# Altium footprint library 3.22-杂项.PcbLib: 985 footprints (part 4 of 64)
Each footprint in its own frame and in the unit in brackets; x right, y up, seen from the top. Pads: shape width x height; smd on the part's side, far side on the other; paste and mask are expansions set on the pad; w line width, h text height; cw(c..) or ccw(c..) is an arc to the next point about the centre after c.
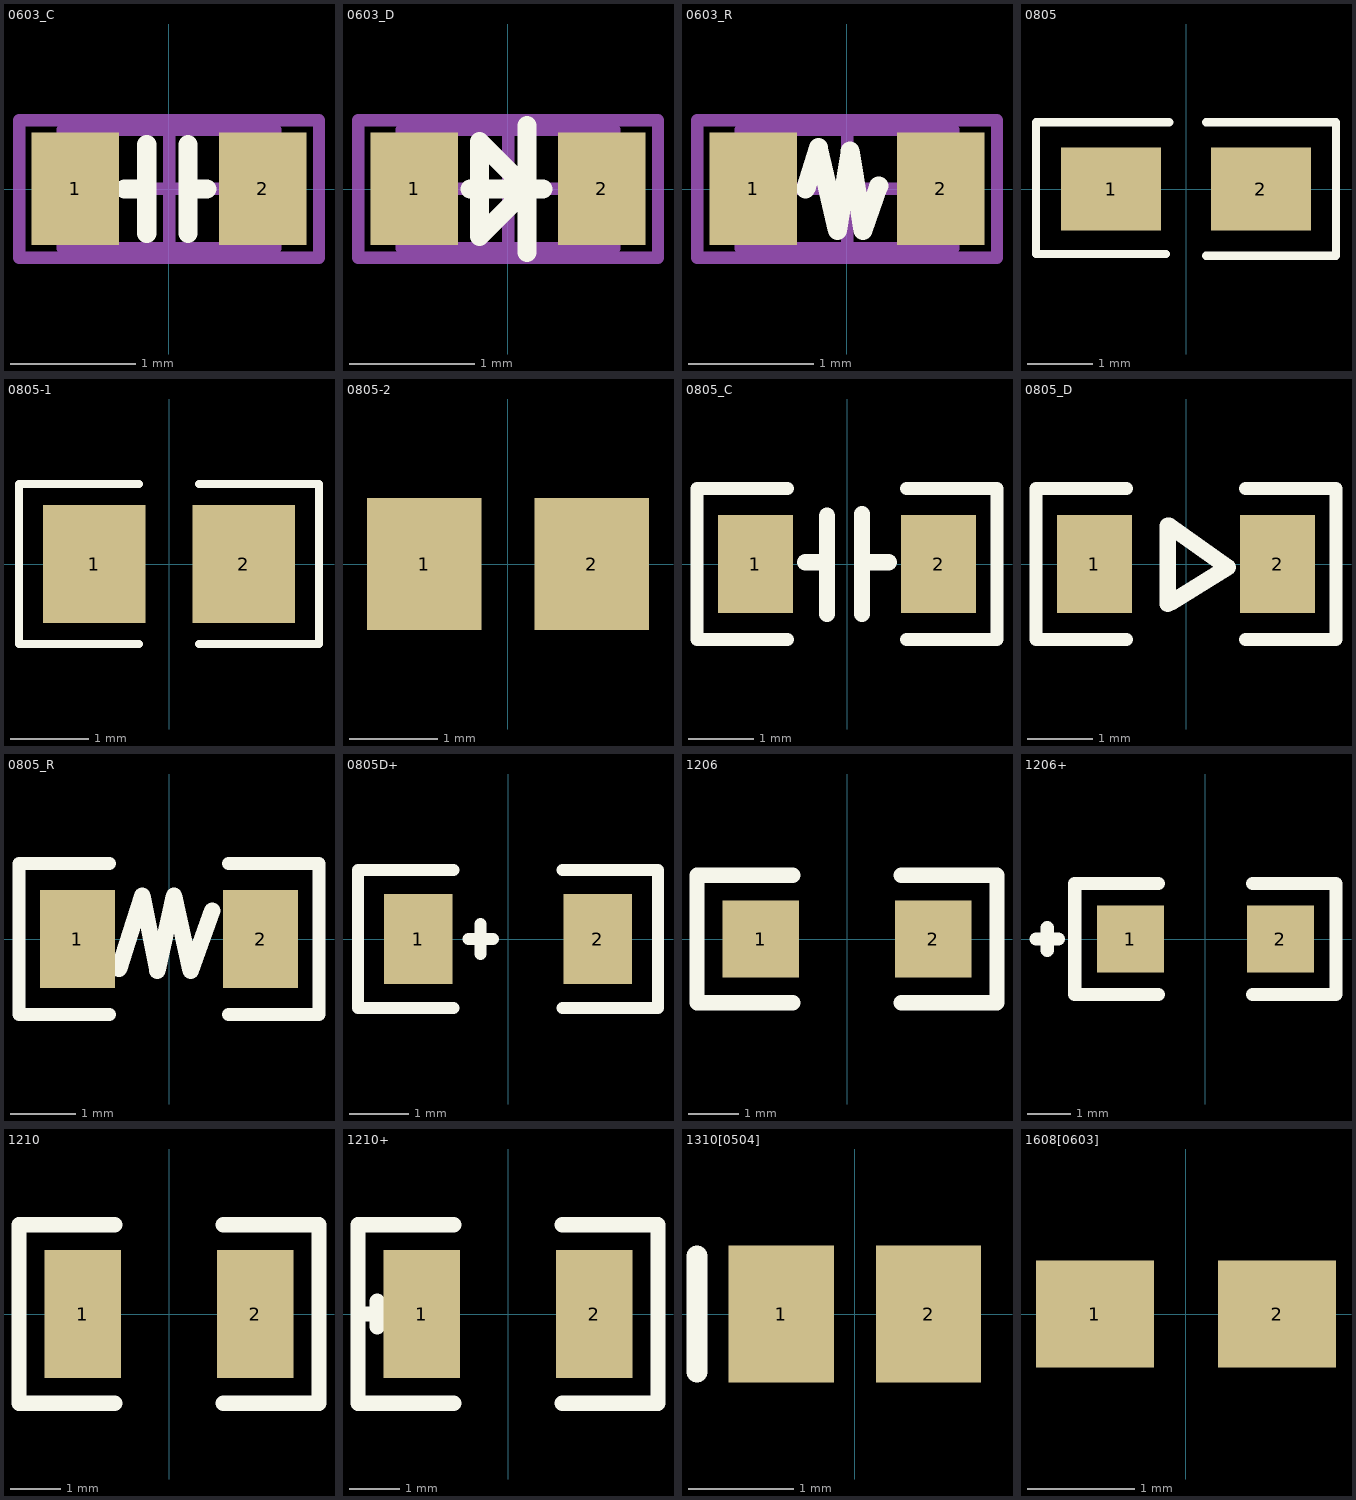
[diagram p3: the footprints below, top view; thin cyan lines are the x and y axes]

## 0603_C [mm]
pads (2):
  rect 0.7x0.9 smd: 1(-0.75,0) 2(0.75,0)
Top Overlay:
  lines w0.152: -0.356,0 -0.229,0 ; -0.178,-0.356 -0.178,0.356 ; 0.152,-0.356 0.152,0.356 ; 0.203,0 0.305,0
Mechanical 13:
  lines w0.1: -0.85,-0.475 -0.85,0.475 0.85,0.475 0.85,-0.475 -0.85,-0.475
Mechanical 15:
  lines w0.1: -0.475,0 0.475,0 ; 0,-0.475 0,0.475 ; -1.2,-0.55 -1.2,0.55 1.2,0.55 1.2,-0.55 -1.2,-0.55
3D body: height 0.9, standoff 0, extent -0.85,-0.475 0.85,0.475

## 0603_D [mm]
pads (2):
  rect 0.7x0.9 smd: 1(-0.75,0) 2(0.75,0)
Top Overlay:
  lines w0.152: -0.305,0 0.279,0 ; 0.127,-0.025 -0.229,-0.381 -0.229,0.381 0.127,0.025 ; 0.152,-0.508 0.152,0.508
Mechanical 13:
  lines w0.1: -0.85,-0.475 -0.85,0.475 0.85,0.475 0.85,-0.475 -0.85,-0.475
Mechanical 15:
  lines w0.1: -0.475,0 0.475,0 ; 0,-0.475 0,0.475 ; -1.2,-0.55 -1.2,0.55 1.2,0.55 1.2,-0.55 -1.2,-0.55
3D body: height 0.9, standoff 0, extent -0.85,-0.475 0.85,0.475

## 0603_R [mm]
pads (2):
  rect 0.7x0.9 smd: 1(-0.75,0) 2(0.75,0)
Top Overlay:
  lines w0.152: -0.33,0 -0.229,0.33 -0.076,-0.33 0.025,0.305 0.127,-0.33 0.254,0.025
Mechanical 13:
  lines w0.1: -0.85,-0.475 -0.85,0.475 0.85,0.475 0.85,-0.475 -0.85,-0.475
Mechanical 15:
  lines w0.1: -0.475,0 0.475,0 ; 0,-0.475 0,0.475 ; -1.2,-0.55 -1.2,0.55 1.2,0.55 1.2,-0.55 -1.2,-0.55
3D body: height 0.9, standoff 0, extent -0.85,-0.475 0.85,0.475

## 0805 [mil]
pads (2):
  rect 60x50 smd: 1(-45,0) 2(45,0)
Top Overlay:
  lines w5: -12,-39 -90,-39 -90,40 -10,40 ; 12,-40 90,-40 90,40 12,40
3D body: height 19.72, standoff -0.24, extent -37.36,-24.6 41.38,24.61

## 0805-1 [mm] "贴片带丝印"
height 1.1
pads (2):
  rect 1.3x1.5 smd: 1(-0.95,0) 2(0.95,0)
Top Overlay:
  lines w0.1: -0.381,-1.016 -1.905,-1.016 -1.905,1.016 -0.381,1.016 ; 0.381,-1.016 1.905,-1.016 1.905,1.016 0.381,1.016
3D body: height 1, standoff 0, extent -1.143,-0.508 -1.016,0.508
3D body: height 1, standoff 0, extent 1.016,-0.508 1.143,0.508
3D body: height 1, standoff 0, extent -1.016,-0.508 1.016,0.508

## 0805-2 [mm] "贴片无丝印"
height 1
pads (2):
  rect 1.3x1.5 smd: 1(-0.95,0) 2(0.95,0)
3D body: height 0.5, standoff -0.01, extent -1,-0.625 1,0.625

## 0805_C [mil]
pads (2):
  rect 45x59.05 smd: 1(-55,0) 2(55,0)
Top Overlay:
  lines w7.87: -35.75,-45.28 -90,-45.28 -90,45.28 -35.75,45.28 ; 35.75,-45.28 90,-45.28 90,45.28 35.75,45.28
  lines w9.84: -25,1 -12,1 ; -12,-30 -12,29 ; 9,-30 9,30 ; 9,1 25,1

## 0805_D [mil]
pads (2):
  rect 45x59.05 smd: 1(-55,0) 2(55,0)
Top Overlay:
  lines w7.87: -35.75,-45.28 -90,-45.28 -90,45.28 -35.75,45.28 ; 35.75,-45.28 90,-45.28 90,45.28 35.75,45.28
  lines w9.84: -11,-24 -11,23 ; -10,23 25,-2 -9,-23

## 0805_R [mil] "0805R, R2012-0401"
pads (2):
  rect 45x59.05 smd: 1(-55,0) 2(55,0)
Top Overlay:
  lines w7.87: -35.75,-45.28 -90,-45.28 -90,45.28 -35.75,45.28 ; 35.75,-45.28 90,-45.28 90,45.28 35.75,45.28
  lines w9.84: -30,-18 -16,26 -7,-19 3,26 13,-19 26,17

## 0805D+ [mm] "0805发光二极管"
pads (2):
  rect 1.143x1.5 smd: 1(-1.5,0) 2(1.5,0)
Top Overlay:
  lines w0.2: -0.908,-1.15 -2.508,-1.15 -2.508,1.15 -0.908,1.15 ; -0.66,0 -0.254,0 ; -0.457,-0.254 -0.457,0.254 ; 0.908,-1.15 2.508,-1.15 2.508,1.15 0.908,1.15

## 1206 [mil] "3.429mm(135mil)间距"
pads (2):
  rect 60x60 smd: 1(-67.5,0) 2(67.5,0)
Top Overlay:
  lines w12: -42.5,-50 -117.5,-50 -117.5,50 -42.5,50 ; 42.5,-50 117.5,-50 117.5,50 42.5,50
3D body: height 21.69, standoff -0.24, extent -56.99,-30.49 69,32.5

## 1206+ [mil] "1206 封装有极性,1脚正,稳压管7.5V9.1V12V"
pads (2):
  rect 60x60 smd: 1(-67.5,0) 2(67.5,0)
Top Overlay:
  lines w12: -152.5,0 -132.5,0 ; -142.5,-10 -142.5,10 ; -42.5,-50 -117.5,-50 -117.5,50 -42.5,50 ; 42.5,-50 117.5,-50 117.5,50 42.5,50

## 1210 [mil]
pads (2):
  rect 60x100 smd: 1(-67.5,0) 2(67.5,0)
Top Overlay:
  lines w12: -42.5,-70 -117.5,-70 -117.5,70 -42.5,70 ; 42.5,-70 117.5,-70 117.5,70 42.5,70

## 1210+ [mil] "也叫3528或B封装"
height 74.8
pads (2):
  rect 60x100 smd: 1(-67.5,0) 2(67.5,0)
Top Overlay:
  lines w12: -112.5,0 -92.5,0 ; -102.5,-10 -102.5,10 ; -42.5,-70 -117.5,-70 -117.5,70 -42.5,70 ; 42.5,-70 117.5,-70 117.5,70 42.5,70

## 1310[0504] [mm] "Chip Capacitor; Body 1.2 x 1.0 mm (LxW typ)"
height 1.35
pads (2):
  rect 1x1.3 smd: 1(-0.7,0) 2(0.7,0)
Top Overlay:
  lines w0.2: -1.5,-0.55 -1.5,0.55

## 1608[0603] [mm] "Chip Capacitor; Body 1.6 x 0.8 mm (LxW typ)"
height 1.35
pads (2):
  rect 1.1x1 smd: 1(-0.85,0) 2(0.85,0)